# Altium footprint library Connectors.PcbLib: 408 footprints (part 25 of 26)
Each footprint in its own frame and in the unit in brackets; x right, y up, seen from the top. Pads: shape width x height; smd on the part's side, far side on the other; paste and mask are expansions set on the pad; w line width, h text height; cw(c..) or ccw(c..) is an arc to the next point about the centre after c.
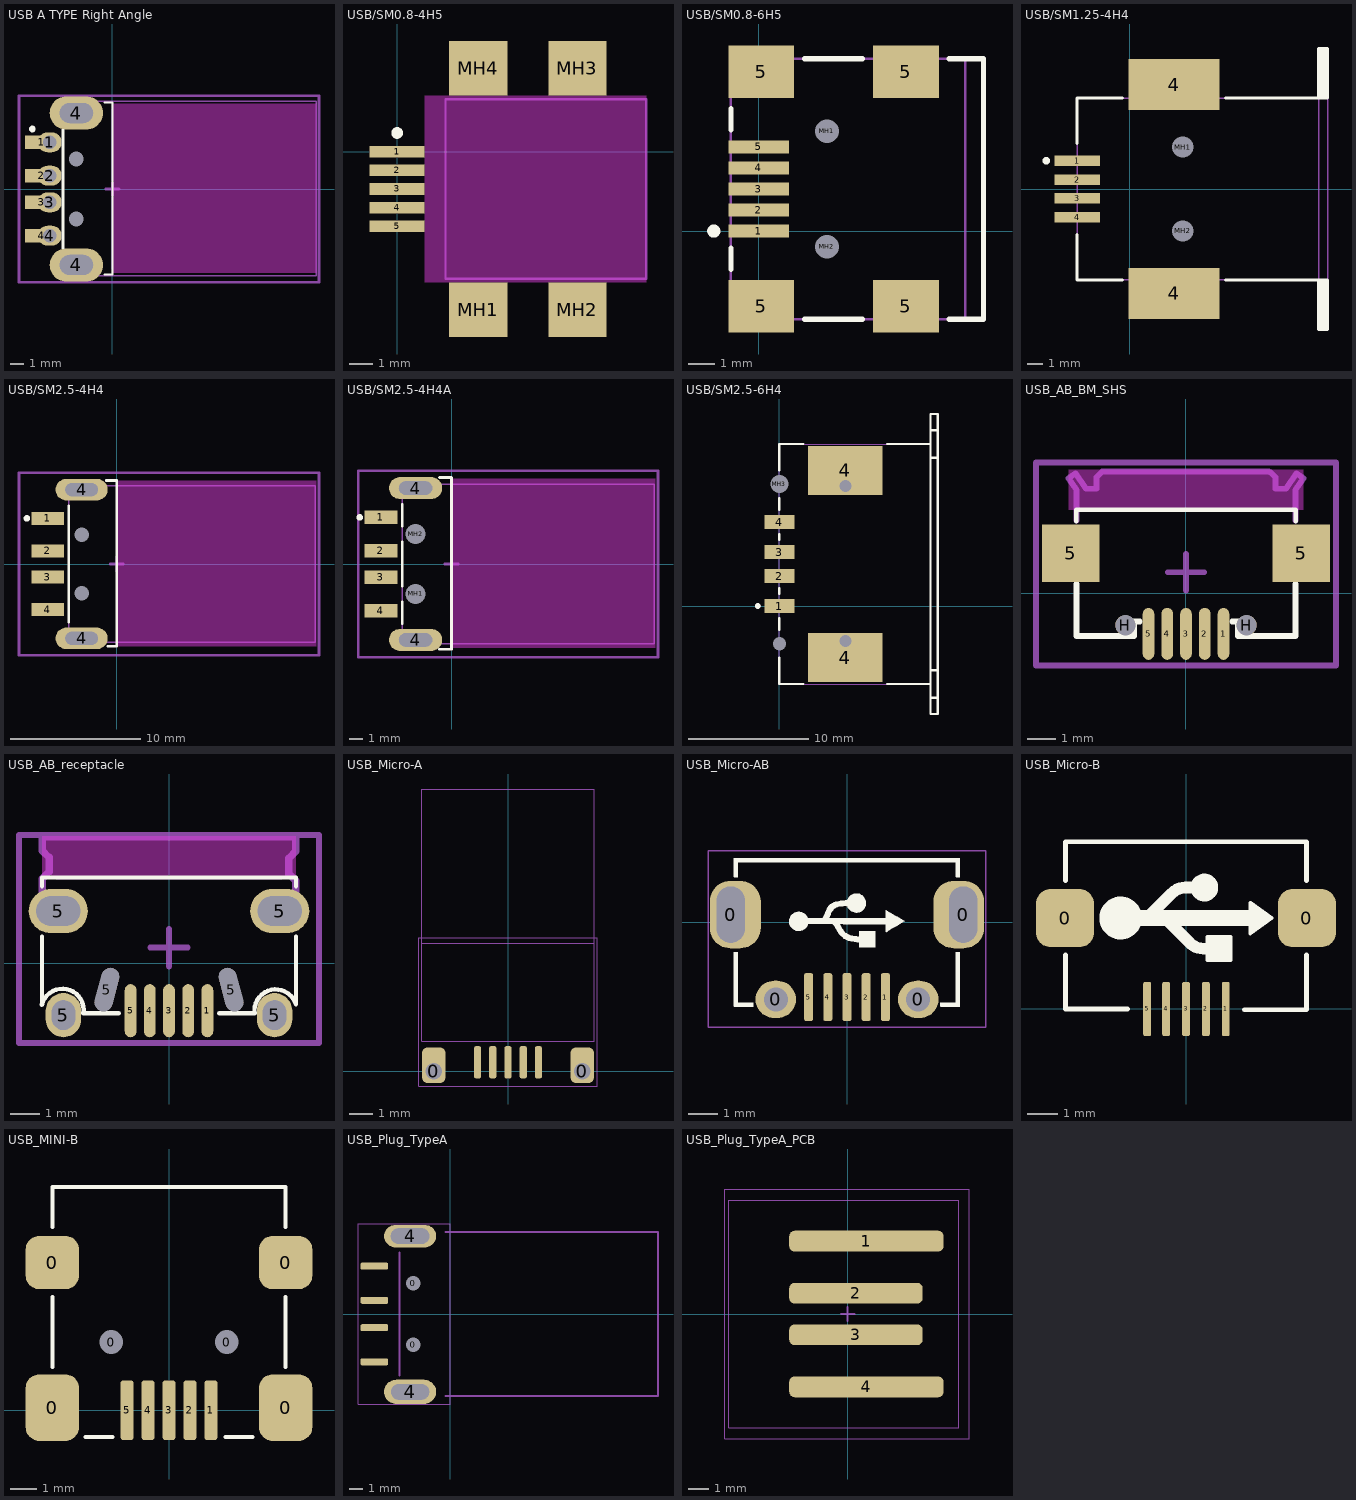
[diagram p24: the footprints below, top view; thin cyan lines are the x and y axes]

## USB2.5-6H16 [mil] "Connector; USB1.1, Type A, Thru-Hole; 4x4x4x4 Position; Right Angle"
height 1292.91

## USB A TYPE Right Angle [mm] "Connector; USB1.1, Type A, SM; 4 Position; Right Angle DESIGNER ABBAS BASEREH"
height 4.5
pads (12):
  rect 2.5x1 smd: 1(-5.3,3.5) 2(-5.3,1) 3(-5.3,-1) 4(-5.3,-3.5)
  oval 1.8x1.5 hole 1: 1(-4.7,3.5) 2(-4.7,1) 3(-4.7,-1) 4(-4.7,-3.5)
  oval 4x2.5 hole 1.5 slot 2.5 at 0 deg: 4(-2.7,-5.7) 4(-2.7,5.7)
  round 0.8 hole 1.1 unplated: MH1(-2.7,-2.25) MH2(-2.7,2.25)
Top Overlay:
  circle w0.25: c-6,4.5 r0.125
  lines w0.15: -0.6,-6.4 0,-6.4 0,6.5 -0.6,6.5
  lines w0.2: -3.7,-4.475 -3.7,4.475
Keep-Out Layer:
  board cut-out: 0,6.4 0,-6.3 15.3,-6.3 15.3,6.4
Mechanical 1:
  lines w0.1: 0,-6 0,6
  text "PCB Edge" at 0.473,-5.173 h0.25
Mechanical 13:
  lines w0.1: -3.7,-6.5 -3.7,6.6 15.3,6.6 15.3,-6.5 -3.7,-6.5
Mechanical 15:
  lines w0.2: -0.5,0 0.5,0 ; 0,-0.5 0,0.5 ; -7,-7 15.5,-7 15.5,7 -7,7 -7,-7
3D body "UP2-AH-1-TH.stEp": height 3.45, standoff -2.9, extent -4.9,-6.3 15.1,6.3

## USB/SM0.8-4H5 [mm] "Connector; USB Mini-B, Sinking Type, SM; 5 Position; Right Angle"
height 0.65
pads (9):
  rect 2.35x0.5 smd: 1(0,0) 2(-0.001,-0.8) 3(-0.001,-1.6) 4(-0.001,-2.4) 5(-0.001,-3.2)
  rect 2.5x2.35 smd: MH1(3.474,-6.775) MH2(7.725,-6.775) MH3(7.725,3.575) MH4(3.474,3.575)
Top Overlay:
  circle w0.25: c-0.001,0.8 r0.125
Keep-Out Layer:
  rectangle: 1.175,-5.6 10.675,2.4
Mechanical 13:
  lines w0.1: 2.074,-5.45 2.074,2.25 10.675,2.25 10.675,-5.45 2.074,-5.45

## USB/SM0.8-6H5 [mm] "Connector; USB2.0, Type B, SM; 5 Position; Right Angle"
height 3.9
pads (11):
  rect 2.3x0.5 smd: 1(0,0) 2(0,0.8) 3(0,1.6) 4(0,2.4) 5(0,3.2)
  rect 2.5x2 smd: 5(0.1,-2.85) 5(0.1,6.05) 5(5.6,-2.85) 5(5.6,6.05)
  round 0.6 hole 0.9 unplated: MH1(2.6,3.8) MH2(2.6,-0.6)
Top Overlay:
  circle w0.25: c-1.7,0 r0.125
  lines w0.2: -1.05,-1.45 -1.05,-0.65 ; -1.05,3.85 -1.05,4.65 ; 1.75,-3.35 3.95,-3.35 ; 1.75,6.55 3.95,6.55 ; 7.25,-3.35 8.55,-3.35 8.55,6.55 7.25,6.55
Mechanical 1:
  lines w0.1: 7.85,-3.35 7.85,6.55
  text "PCB Edge" at 8.282,-2.436 h0.25
Mechanical 13:
  lines w0.1: -1.05,-3.35 8.55,-3.35 8.55,6.55 -1.05,6.55 -1.05,-3.35
3D body "usb_a-usb_b-m5-smd-c.STEP": height 3.93, standoff -1, extent -0.75,-3.35 8.5,6.55

## USB/SM1.25-4H4 [mm] "Connector; USB1.1, Type B, SM; 4 Position; Right Angle"
height 11
pads (8):
  rect 3x0.7 smd: 1(-3.5,1.875) 2(-3.5,0.625) 3(-3.5,-0.625) 4(-3.5,-1.875)
  rect 6.04x3.4 smd: 4(2.92,-6.92) 4(2.92,6.92)
  round 1.1 hole 1.4 unplated: MH1(3.5,2.775) MH2(3.5,-2.775)
Top Overlay:
  circle w0.25: c-5.55,1.875 r0.125
  rectangle: 12.5,-9.32 13.1,-6.02
  rectangle: 12.5,6.02 13.1,9.32
  lines w0.2: -3.5,-3 -3.5,-6.02 -0.5,-6.02 ; -3.5,3 -3.5,6.02 -0.5,6.02 ; 6.34,-6.02 12.5,-6.02 ; 6.34,6.02 12.5,6.02 ; 12.5,-6.02 13.1,-6.02 13.1,-9.32 12.5,-9.32 12.5,-6.02 ; 12.5,6.02 13.1,6.02 13.1,9.32 12.5,9.32 12.5,6.02
Mechanical 1:
  lines w0.1: 12.5,-6.02 12.5,6.02
  text "PCB Edge" at 12.281,-5.75 h0.25
Mechanical 13:
  lines w0.1: 12.5,-6.02 12.5,-9.32 13.1,-9.32 13.1,9.32 12.5,9.32 12.5,6.02 ; 13.1,-6.02 -3.5,-6.02 -3.5,6.02 13.1,6.02
3D body "14383.STEP": height 11, standoff -1.5, extent -4.635,-8.103 12.515,8.097
3D body "Samtec-DEFAULT.STEP": height 11.05, standoff 0.55, extent 3.305,-5.498 69.255,5.702

## USB/SM2.5-4H4 [mm] "Connector; USB1.1, Type A, SM; 4 Position; Right Angle DESIGNER ABBAS BASEREH"
height 4.5
pads (8):
  rect 2.5x1 smd: 1(-5.3,3.5) 2(-5.3,1) 3(-5.3,-1) 4(-5.3,-3.5)
  oval 4x1.65 hole 1 slot 2.5 at 0 deg: 4(-2.7,-5.7) 4(-2.7,5.7)
  round 0.8 hole 1.1 unplated: MH1(-2.7,-2.25) MH2(-2.7,2.25)
Top Overlay:
  circle w0.25: c-6.9,3.5 r0.125
  lines w0.2: -3.7,-4.475 -3.7,4.475 ; -0.8,6.4 0,6.4 0,-6.3 -0.7,-6.3
Keep-Out Layer:
  board cut-out: 0,6.4 0,-6.3 15.3,-6.3 15.3,6.4
Mechanical 1:
  lines w0.1: 0,-6 0,6
  text "PCB Edge" at 0.473,-5.173 h0.25
Mechanical 13:
  lines w0.1: -3.7,-6 -3.7,6 15.2,6 15.2,-6 -3.7,-6
Mechanical 15:
  lines w0.2: -0.5,0 0.5,0 ; 0,-0.5 0,0.5 ; -7.5,-7 15.5,-7 15.5,7 -7.5,7 -7.5,-7
3D body "14381.STEP": height 3.13, standoff -2.67, extent -5.3,-6.303 15,6.303

## USB/SM2.5-4H4A [mm] "Connector; USB1.1, Type A, SM; 4 Position; Right Angle"
height 4.5
pads (8):
  rect 2.5x1 smd: 1(-5.3,3.5) 2(-5.3,1) 3(-5.3,-1) 4(-5.3,-3.5)
  oval 4x1.65 hole 1 slot 2.5 at 0 deg: 4(-2.7,-5.7) 4(-2.7,5.7)
  round 1.2 hole 1.5 unplated: MH1(-2.7,-2.25) MH2(-2.7,2.25)
Top Overlay:
  circle w0.25: c-6.9,3.5 r0.125
  lines w0.2: -3.7,-4.475 -3.7,-2.83 ; -3.7,-1.68 -3.7,1.68 ; -3.7,2.83 -3.7,4.475 ; -0.9,-6.4 0,-6.4 0,6.5 -0.9,6.5
Keep-Out Layer:
  board cut-out: 0,6.4 0,-6.3 15.3,-6.3 15.3,6.4
Mechanical 1:
  lines w0.1: 0,-6 0,6
  text "PCB Edge" at 0.473,-5.173 h0.25
Mechanical 13:
  lines w0.1: -3.7,-6 -3.7,6 15.2,6 15.2,-6 -3.7,-6
Mechanical 15:
  lines w0.2: -0.5,0 0.5,0 ; 0,-0.5 0,0.5 ; -7,-7 -7,7 15.5,7 15.5,-7 -7,-7
3D body "14381.STEP": height 3.13, standoff -2.67, extent -5.25,-6.3 15.05,6.306

## USB/SM2.5-6H4 [mm] "Connector; USB1.1, Type A, SM; 4 Position; Right Angle"
height 7.8
pads (10):
  rect 2.5x1.2 smd: 1(0,0) 2(0,2.5) 3(0,4.5) 4(0,7)
  rect 6.2x4.1 smd: 4(5.5,-4.3) 4(5.5,11.3)
  round 0.7 hole 1 unplated: MH1(5.5,9.996) MH2(5.5,-2.904)
  round 1.2 hole 1.5 unplated: MH3(0,10.15)
  round 0.8 hole 1.1 unplated: MH4(0,-3.15)
Top Overlay:
  circle w0.25: c-1.8,0 r0.125
  lines w0.2: 0,-4.3 0,-6.5 2,-6.5 ; 0,-2 0,-1 ; 0,1 0,1.5 ; 0,5.5 0,6 ; 0,8 0,9 ; 0,11.3 0,13.5 2,13.5 ; 9,-6.5 12.6,-6.5 ; 9,13.5 12.6,13.5 ; 12.6,-7.65 13.176,-7.65 ; 12.6,-5.35 13.2,-5.35 ; 12.6,12.35 13.188,12.35 ; 12.6,14.65 13.188,14.65 ; 12.6,-9 13.2,-9 13.2,16 12.6,16 12.6,-9
Mechanical 13:
  lines w0.1: 0,-6.5 0,13.5 12.6,13.5 12.6,16 13.2,16 13.2,-9 12.6,-9 12.6,-6.5 0,-6.5
3D body: height 7.8, standoff 0, extent 0.001,-8.999 13.199,15.999

## USB_AB_BM_SHS [mm] "USB Micro AB - Standard (Bottom mount), Shell SMT DESIGNER ABBAS BASEREH"
height 2.8
pads (9):
  oval 0.4x1.8 smd: 1(1.3,-1.4) 2(0.65,-1.4) 3(0,-1.4) 4(-0.65,-1.4) 5(-1.3,-1.4)
  rect 2x2 smd: 5(-4,1.4) 5(4,1.4)
  round 0.7 hole 0.7: H(-2.1,-1.1) H(2.1,-1.1)
Top Overlay:
  lines w0.15: -3.8,2.5 -3.8,2.9 3.8,2.9 3.8,2.5
  lines w0.2: -3.8,0.33 -3.8,-0.17 -3.8,-1.47 -1.9,-1.47 -1.8,-1.47 -1.8,-0.97 -1.6,-0.97 ; 1.6,-0.97 1.8,-0.97 1.8,-1.47 1.9,-1.47 3.8,-1.47 3.8,-0.17 3.8,0.33
Keep-Out Layer:
  board cut-out: -4.064,2.9 -4.064,4.291 4.064,4.291 4.064,2.9
Mechanical 1:
  lines w0.1: -3.8,2.894 3.8,2.894
  lines w0.2: -3.8,2.53 -3.8,3.591 -4.078,3.992 -3.831,4.163 -3.462,3.63 -3.1,3.63 -3.1,4.03 -2.9,4.23 2.87,4.23 2.9,4.2 2.93,4.2 3.1,4.03 3.1,3.63 3.462,3.63 3.831,4.163 4.078,3.992 3.8,3.591 3.8,2.53
  text "PCB EDGE" at -2.413,3.148 h0.7
Mechanical 15:
  lines w0.2: -0.635,0.735 0.635,0.735 ; 0,0.1 0,1.37 ; -5.2,-2.5 5.2,-2.5 5.2,4.545 -5.2,4.545 -5.2,-2.5
3D body "65944.stEp": height 2.75, standoff -0.55, extent -4,-1.78 4,4.264

## USB_AB_receptacle [mm] "USB Micro AB - receptacle  DESIGNER ABBAS BASEREH"
height 2.8
pads (11):
  oval 0.4x1.8 smd mask+0.05: 1(1.3,-1.612) 2(0.65,-1.612) 3(0,-1.612) 4(-0.65,-1.612) 5(-1.3,-1.612)
  oval 2x1.5 hole 1 slot 1.5 at 0 deg mask+0.05: 5(-3.75,1.763) 5(3.75,1.763)
  oval 1.2x1.5 hole 0.8 slot 1 at 90 deg mask+0.05: 5(-3.575,-1.762) 5(3.575,-1.762)
  oval 1.5x0.6 / inner oval 1.5x0.6 / far side oval 2x1 hole 0.6 slot 1.5 at 75 deg rot 75 mask+0.05: 5(-2.1,-0.9)
  oval 1.5x0.6 / inner oval 1.5x0.6 / far side oval 2x1 hole 0.6 slot 1.5 at 105 deg rot 105 mask+0.05: 5(2.1,-0.9)
Top Overlay:
  lines w0.15: -4.307,-1.416 cw(c-3.609,-1.587) -2.9,-1.7 -1.7,-1.7 ; -4.3,-1.4 -4.3,0.9 ; -4.3,2.6 -4.3,2.888 -4.288,2.9 4.3,2.9 4.3,2.6 ; 1.7,-1.7 2.9,-1.7 cw(c3.613,-1.61) 4.3,-1.4 4.3,0.9
Keep-Out Layer:
  board cut-out: -4.3,2.888 -4.3,4.3 4.3,4.3 4.3,2.888
Mechanical 1:
  lines w0.1: -3.8,2.882 3.8,2.882
  text "PCB EDGE" at -1.8,3.088 h0.5
Mechanical 13:
  lines w0.254: -4.3,2.388 -4.3,2.863 -4.064,3.099 -4.064,3.577 -4.3,3.813 -4.3,4.288 4.3,4.288 4.3,3.788 4.064,3.552 4.064,3.024 4.3,2.788 4.3,2.288
Mechanical 15:
  lines w0.2: -0.635,0.523 0.635,0.523 ; 0,-0.112 0,1.158 ; -5.08,-2.7 -5.08,4.333 5.08,4.333 5.08,-2.7 -5.08,-2.7
3D body "48281.stEp": height 2.8, standoff -0.6, extent -4.325,-1.512 4.325,4.386

## USB_Micro-A [mil]
height 153.54
pads (7):
  rrect50% 40x60 hole 28 copper offset 0,10: 0(-125,0) 0(125,0)
  rrect50% 12x54 smd: 1(-51.18,15) 2(-25.59,15) 3(0,15) 4(25.59,15) 5(51.18,15)
Mechanical 13:
  lines w2: -145,215 145,215 ; -145,50 145,50 145,475 -145,475 -145,50
Mechanical 14:
  lines w2: -150,-25 150,-25 150,225 -150,225 -150,-25
  text ".Designator" at -90,80 h100
3D body "UJ2-MIBH-4-SMT.stp": height 108.27, standoff -24.02, extent -147.64,-15 147.64,449.57

## USB_Micro-AB [mil]
height 153.54
pads (9):
  rrect80% 68x90 hole 37 slot 75 at 90 deg copper offset 6,0 mask+0: 0(-155,10)
  oval 54x50 hole 32 mask+0: 0(-95,-103) 0(95,-103)
  rrect80% 68x90 hole 37 slot 75 at 90 deg copper offset -6,0 mask+0: 0(155,10)
  rrect50% 12x64 smd: 1(51.18,-100) 2(25.59,-100) 3(0,-100) 4(-25.59,-100) 5(-51.18,-100)
Top Overlay:
  drawing of 24 lines, arcs and shapes, not listed
Mechanical 14:
  lines w2: -185,-140 185,-140 185,95 -185,95 -185,-140
  text ".Designator" at -90,-45 h100
3D body "User Library-MicroUSB-B_Molex_105017-0001.STEP": height 108.07, standoff -21.85, extent -161.42,-109.33 161.42,104.45

## USB_Micro-B [mil]
height 153.54
pads (7):
  rrect50% 74.8x74.8 smd: 0(-155.51,116.84) 0(155.51,116.84)
  rrect50% 10x70 smd: 1(51.18,0) 2(25.59,0) 3(0,0) 4(-25.59,0) 5(-50,0)
Top Overlay:
  circle w20: c23.56,156.21 r7.87
  circle w35: c-84.07,117 r10
  region: 57.03,62.87 27.5,62.87 27.5,92.39 57.03,92.39
  region: 110.18,117 82.62,97.31 82.62,136.69
  lines w5: 27.5,62.87 57.03,62.87 57.03,92.39 27.5,92.39 27.5,62.87 ; 82.62,97.31 82.62,136.69 110.18,117 82.62,97.31
  lines w6: -155,69.8 -155,0 -75,0 ; -155,164.84 -155,215 155,215 155,164.84 ; 75,-1 155,-1 155,69.8
  lines w15: -52.85,114.46 -18.48,148.83 cw(c-0.65,131) -0.65,156.21 22.5,156.21 ; -24.7,114.54 4.83,85.01 ccw(c22.66,102.84) 22.66,77.63 42.5,77.63
  lines w20: -82.5,117 92.5,117
3D body "Micro USB.STP": height 106.7, standoff -9.04, extent -156.58,4.51 157.59,218.29

## USB_MINI-B [mil]
height 153.54
pads (11):
  rrect50% 80x100 smd: 0(-175.2,3.94) 0(175.19,3.94)
  rrect50% 80x80 smd: 0(-175.2,221.69) 0(175.19,221.69)
  round 23.62 hole 35.43 unplated: 0(-86.61,102.36) 0(86.61,102.36)
  rrect50% 20x90 smd: 1(62.99,0) 2(31.5,0) 3(0,0) 4(-31.5,0) 5(-62.99,0)
Top Overlay:
  lines w6: -175,65 -175,170 ; -175,275 -175,335 175,335 175,275 ; -125,-40 -85,-40 ; 85,-40 125,-40 ; 175,65 175,170
3D body "User Library-USB_mini_B.STEP": height 155.51, standoff -39.37, extent -210.63,-27.56 210.63,334.64

## USB_Plug_TypeA [mil]
height 177.17
pads (8):
  round 32 hole 42: 0(-106.3,-88.58) 0(-106.3,88.58)
  rrect50% 80x20 smd: 1(-218,137.8) 2(-218,39.37) 3(-218,-39.37) 4(-218,-137.8)
  oval 150x70 hole 45 slot 110 at 0 deg: 4(-115,-224)
  oval 150x65 hole 45 slot 111 at 0 deg: 4(-115,224)
Mechanical 13:
  lines w6: -145.67,-176.18 -145.67,176.18 ; -12.99,-236.22 598.43,-236.22 598.43,236.22 -12.99,236.22
Mechanical 14:
  lines w2: -265,-260 -265,260 0,260 0,-260 -265,-260
  text ".Designator" at -220,-25 h100
3D body "SW3dPS-USB-Male Port.STEP": height 70, standoff -117.5, extent -145.67,-236.37 576.08,236.37

## USB_Plug_TypeA_PCB [mm]
height 3.9
pads (4):
  rrect50% 7.41x1 smd: 1(0.897,3.5) 4(0.897,-3.5)
  rrect50% 6.41x1 smd: 2(0.397,1) 3(0.397,-1)
Mechanical 13:
  lines w0.051: -5.908,-6 5.842,-6 5.842,6 -5.908,6 -5.908,-6 ; -5.715,-5.461 -5.715,5.461 5.334,5.461 5.334,-5.461 -5.715,-5.461
  lines w0.1: -0.33,0 0.33,0 ; 0,-0.33 0,0.33